# Altium footprint library PCBLIB.PcbLib: 557 footprints (part 10 of 36)
Each footprint in its own frame and in the unit in brackets; x right, y up, seen from the top. Pads: shape width x height; smd on the part's side, far side on the other; paste and mask are expansions set on the pad; w line width, h text height; cw(c..) or ccw(c..) is an arc to the next point about the centre after c.
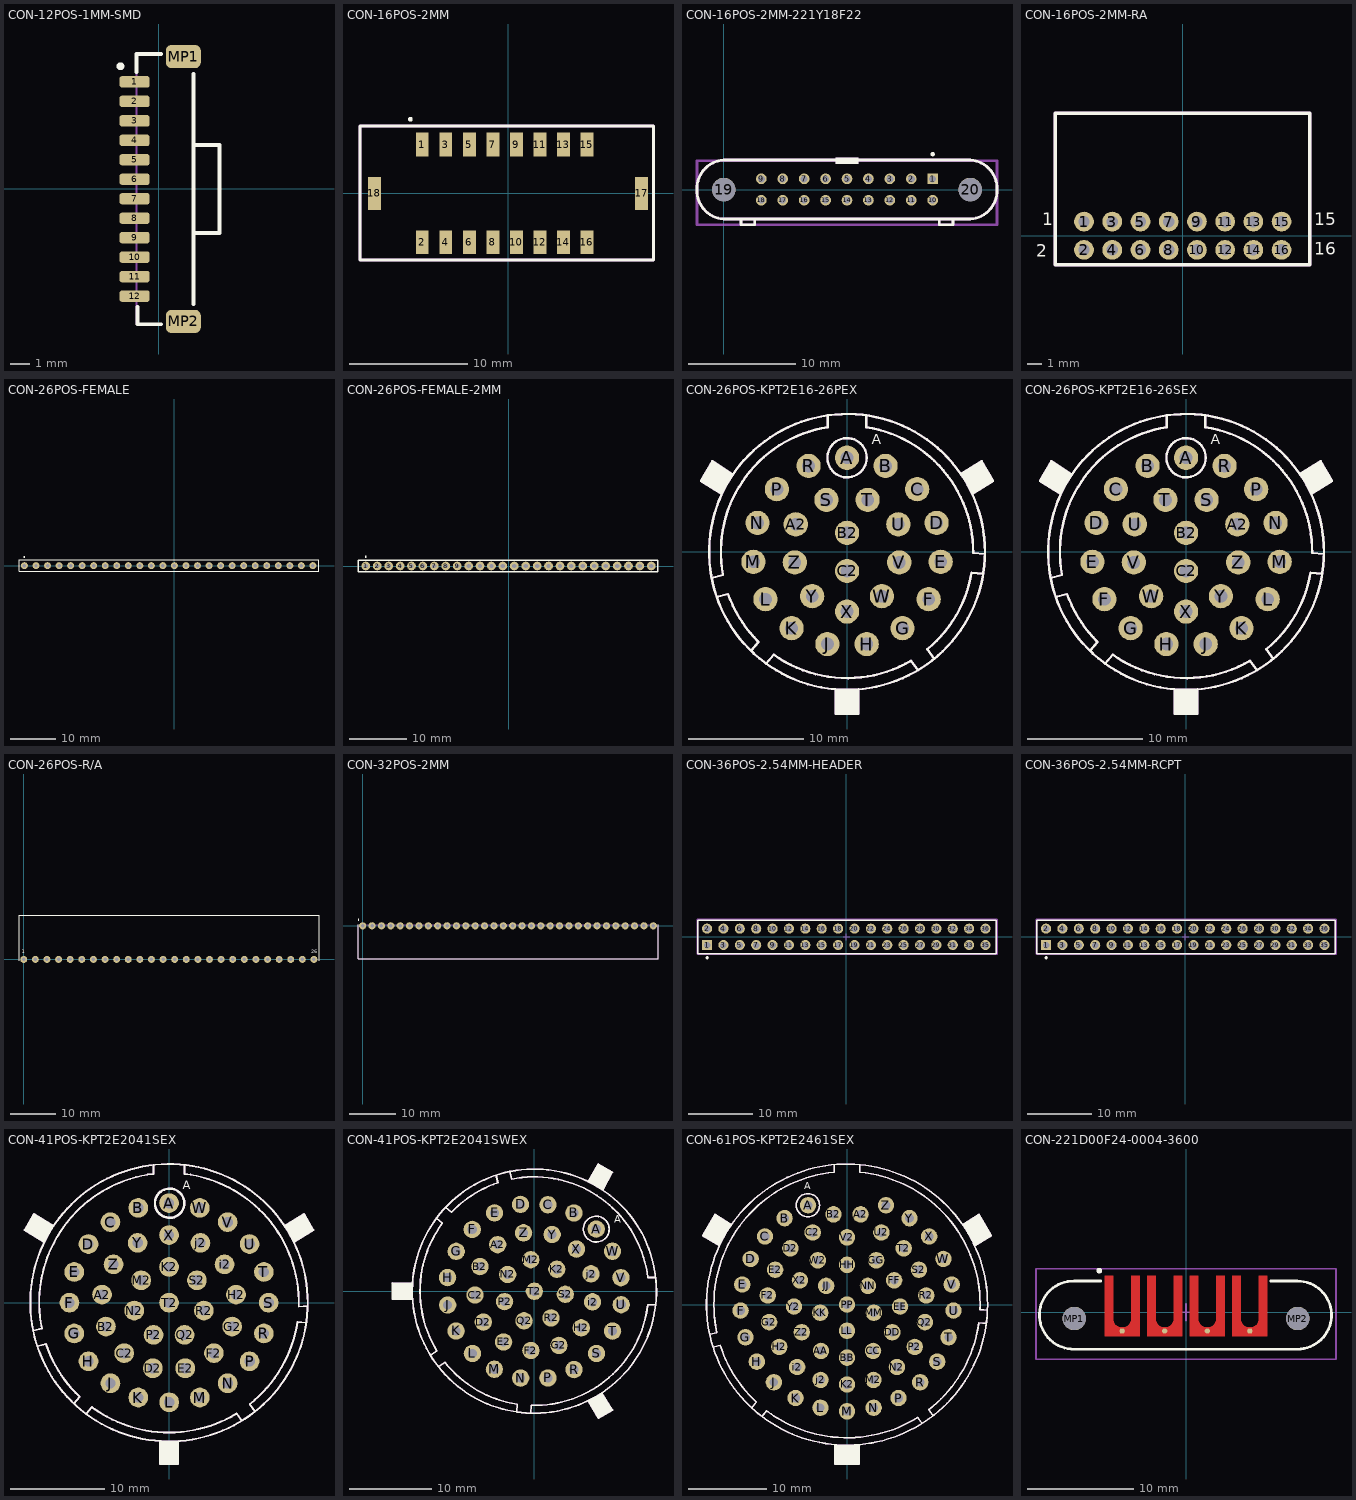
[diagram p9: the footprints below, top view; thin cyan lines are the x and y axes]

## CON-12POS-1MM-SMD [mm]
pads (14):
  rrect50% 1.55x0.6 smd mask+0.05: 1(-1.25,5.5) 2(-1.25,4.5) 3(-1.25,3.5) 4(-1.25,2.5) 5(-1.25,1.5) 6(-1.25,0.5) 7(-1.25,-0.5) 8(-1.25,-1.5) 9(-1.25,-2.5) 10(-1.25,-3.5) 11(-1.25,-4.5) 12(-1.25,-5.5)
  rrect50% 1.8x1.2 smd mask+0.05: MP1(1.25,6.8) MP2(1.25,-6.8)
Top Overlay:
  circle w0.2: c-1.98,6.3 r0.1
  lines w0.2: -1.16,6.01 -1.16,6.931 0.1,6.931 ; -1.102,-6.048 -1.102,-6.941 0.1,-6.941 ; 1.781,-5.9 1.781,-2.25 ; 1.781,5.9 1.781,2.25 ; 1.781,-2.25 3.11,-2.25 3.11,2.25 1.781,2.25 ; 1.781,-2.25 1.781,-2.25 ; 1.781,-2.25 1.781,2.25
ASM Top:
  lines w0.1: 0.1,-6.941 -1.16,-6.941 -1.16,6.01 -1.16,6.931 0.1,6.931 ; 1.781,-2.25 3.11,-2.25 ; 1.781,2.25 3.11,2.25 3.11,-2.25 ; 1.781,5.9 1.781,-5.9 ; 1.781,-5.9 1.781,-5.9 ; 3.11,-2.25 3.11,-2.25
  text ".designator" at 0.1,0 h0.8
3D body "5013311207.stp": height 5.5, standoff -0.04, extent -1.76,-7.12 3.59,7.12

## CON-16POS-2MM [mm]
pads (18):
  rect 1.1x2 smd: 1(-7.29,4.15) 2(-7.29,-4.15) 3(-5.29,4.15) 4(-5.29,-4.15) 5(-3.29,4.15) 6(-3.29,-4.15) 7(-1.29,4.15) 8(-1.29,-4.15) 9(0.71,4.15) 10(0.71,-4.15) 11(2.71,4.15) 12(2.71,-4.15) 13(4.71,4.15) 14(4.71,-4.15) 15(6.71,4.15) 16(6.71,-4.15)
  rect 1.1x2.8 smd: 17(11.35,0) 18(-11.35,0)
Top Overlay:
  circle w0.2: c-8.299,6.3 r0.1
  lines w0.254: -12.573,-5.664 -12.573,5.715 12.37,5.715 12.37,-5.664 -12.573,-5.664
ASM Top:
  lines w0.254: -12.573,-5.664 -12.573,5.715 12.37,5.715 12.37,-5.664 -12.573,-5.664
  text ".designator" at -8.001,-0.178 h0.8
3D body "DF11G-16DP-2V.stp": height 7.16, standoff -1.04, extent -12.118,-4.496 11.582,4.704

## CON-16POS-2MM-221Y18F22 [mm] "Nicomatic 221Y18F22"
height 5.6
pads (20):
  rect 1x1 hole 0.65: 1(19.5,1)
  round 1 hole 0.65: 2(17.5,1) 3(15.5,1) 4(13.5,1) 5(11.5,1) 6(9.5,1) 7(7.5,1) 8(5.5,1) 9(3.5,1) 10(19.5,-1) 11(17.5,-1) 12(15.5,-1) 13(13.5,-1) 14(11.5,-1) 15(9.5,-1) 16(7.5,-1) 17(5.5,-1) 18(3.5,-1)
  round 2.2 hole 2.2 unplated: 19(0,0) 20(23,0)
Top Overlay:
  circle w0.2: c19.501,3.3 r0.1
  rectangle: 10.438,2.4 12.585,3
  lines w0.254: 1.6,-2.75 1.6,-3.3 2.9,-3.3 2.9,-2.75 ; 20.1,-2.75 20.1,-3.3 21.4,-3.3 21.4,-2.75 ; -2.5,0 ccw(c0.125,-0.125) 0,-2.75 23,-2.75 ccw(c22.875,-0.125) 25.5,0 ccw(c22.875,0.125) 23,2.75 0,2.75 ccw(c0.125,0.125) -2.5,0
Mechanical 15:
  lines w0.254: -2.5,-3.3 -2.5,2.7 25.5,2.7 25.5,-3.3 -2.5,-3.3
ASM Top:
  rectangle: 10.438,2.4 12.585,3
  lines w0.254: 1.6,-2.75 1.6,-3.3 2.9,-3.3 2.9,-2.75 ; 20.1,-2.75 20.1,-3.3 21.4,-3.3 21.4,-2.75 ; -2.5,0 cw(c0.125,0.125) 0,2.75 23,2.75 cw(c22.875,0.125) 25.5,0 cw(c22.875,-0.125) 23,-2.75 0,-2.75 cw(c0.125,-0.125) -2.5,0
  text ".designator" at 9.1,-0.2 h0.8
3D body "221Y18F22.STEP": height 5.8, standoff -4.8, extent -2.499,-3.271 25.501,2.729

## CON-16POS-2MM-RA [mm]
pads (16):
  round 1.4 hole 0.8: 1(-7,1) 2(-7,-1) 3(-5,1) 4(-5,-1) 5(-3,1) 6(-3,-1) 7(-1,1) 8(-1,-1) 9(1,1) 10(1,-1) 11(3,1) 12(3,-1) 13(5,1) 14(5,-1) 15(7,1) 16(7,-1)
Top Overlay:
  lines w0.254: -9.032,-2.048 9.002,-2.048 9.002,8.671 -9.032,8.671 -9.032,-2.048
  text "1" at -9.946,0.416 h1.52
  text "2" at -10.404,-1.794 h1.52
  text "15" at 9.332,0.416 h1.52
  text "16" at 9.332,-1.667 h1.52
ASM Top:
  lines w0.254: -9.032,-2.048 -9.032,8.671 9.002,8.671 9.002,-2.048 -9.032,-2.048
  text ".designator" at -7.889,3.134 h0.8
3D body "DF11-16DPOS-2DS-RA.stp": height 5.16, standoff -2.84, extent -9.007,-1.337 8.993,8.663

## CON-26POS-FEMALE [mil]
pads (26):
  round 60 hole 30: 1(-1300,0) 2(-1200,0) 3(-1100,0) 4(-1000,0) 5(-900,0) 6(-800,0) 7(-700,0) 8(-600,0) 9(-500,0) 10(-400,0) 11(-300,0) 12(-200,0) 13(-100,0) 14(0,0) 15(100,0) 16(200,0) 17(300,0) 18(400,0) 19(500,0) 20(600,0) 21(700,0) 22(800,0) 23(900,0) 24(1000,0) 25(1100,0) 26(1200,0)
Top Overlay:
  circle w7.87: c-1300,74.8 r3.94
  lines w10: -1347.24,-50 -1347.24,50 1252.76,50 1252.76,-50 -1347.24,-50
3D body "SS-126-TT-2.stp": height 175.87, standoff -124.13, extent -1347.24,-50 1252.76,50

## CON-26POS-FEMALE-2MM [mil]
pads (26):
  round 60 hole 30: 1(-984.25,0) 2(-905.51,0) 3(-826.77,0) 4(-748.03,0) 5(-669.29,0) 6(-590.55,0) 7(-511.81,0) 8(-433.07,0) 9(-354.33,0) 10(-275.59,0) 11(-196.85,0) 12(-118.11,0) 13(-39.37,0) 14(39.37,0) 15(118.11,0) 16(196.85,0) 17(275.59,0) 18(354.33,0) 19(433.07,0) 20(511.81,0) 21(590.55,0) 22(669.29,0) 23(748.03,0) 24(826.77,0) 25(905.51,0) 26(984.25,0)
Top Overlay:
  circle w7.87: c-984.25,62.99 r3.94
  lines w10: -1038.04,-39.35 1030.15,-39.35 1030.15,39.35 -1038.04,39.35 -1038.04,-39.35
3D body "MMS-126-01-F-SV.stp": height 175, standoff -115, extent -1038.04,-39.35 1030.15,39.35

## CON-26POS-KPT2E16-26PEX [mm]
pads (26):
  round 2.1 hole 1.1: A(0,8.15) A2(-4.44,2.39) B(3.33,7.44) B2(0,1.65) C(6.07,5.43) C2(0,-1.65) D(7.75,2.51) E(8.1,-0.86) F(7.06,-4.09) G(4.8,-6.6) H(1.7,-7.97) J(-1.7,-7.97) K(-4.8,-6.6) L(-7.06,-4.09) M(-8.1,-0.86) N(-7.75,2.51) P(-6.07,5.43) R(-3.33,7.44) S(-1.78,4.5) T(1.78,4.5) U(4.44,2.39) V(4.52,-0.91) W(3.02,-3.83) X(0,-5.16) Y(-3.02,-3.83) Z(-4.52,-0.91)
Top Overlay:
  circle w0.2: c0,0 r11.934
  circle w0.2: c0,8.15 r1.7
  region: -0.994,-11.893 -0.994,-14.025 0.986,-14.025 0.994,-11.893
  region: 11.647,7.87 9.844,6.748 10.823,5.029 12.637,6.155
  region: -11.655,7.87 -12.645,6.155 -10.823,5.029 -9.89,6.679
  lines w0.2: -11.718,-2.254 -10.74,-1.992 ; -11.277,-3.906 -10.296,-3.644 ccw(c0,0) -7.655,-7.79 -8.308,-8.566 ; -10.823,5.029 -12.645,6.155 -11.655,7.87 -9.89,6.679 ; -10.733,-1.991 cw(c0.005,0) -1.66,10.794 -1.66,11.815 ; -6.997,-9.665 -6.345,-8.889 ccw(c0,0) 5.542,-9.41 ; -0.994,-11.893 -0.994,-14.025 0.986,-14.025 0.994,-11.893 ; 1.65,10.791 cw(c0,0) 10.916,-0.097 11.924,-0.185 ; 1.65,10.794 1.65,11.815 ; 5.541,-9.408 6.12,-10.238 ; 7.521,-9.257 6.941,-8.427 ccw(c0,0) 10.77,-1.789 ; 9.844,6.748 11.647,7.87 12.637,6.155 10.823,5.029 ; 10.767,-1.801 11.775,-1.889
  text "A" at 2.134,9.017 h1.5
ASM Top:
  circle w0.2: c0,8.15 r1.7
  circle w0.2: c0,0 r11.934
  region: -11.655,7.87 -12.645,6.155 -10.823,5.029 -9.89,6.679
  region: 11.647,7.87 9.844,6.748 10.823,5.029 12.637,6.155
  region: -0.994,-11.893 -0.994,-14.025 0.986,-14.025 0.994,-11.893
  lines w0.2: -11.718,-2.254 -10.74,-1.992 ; -11.277,-3.906 -10.296,-3.644 ccw(c0,0) -7.655,-7.79 -8.308,-8.566 ; -10.823,5.029 -12.645,6.155 -11.655,7.87 -9.89,6.679 ; -10.733,-1.991 cw(c0.005,0) -1.66,10.794 -1.66,11.815 ; -6.997,-9.665 -6.345,-8.889 ccw(c0,0) 5.542,-9.41 ; -0.994,-14.025 -0.994,-11.893 ; 0.986,-14.025 0.994,-11.893 ; 1.65,10.791 cw(c0,0) 10.916,-0.097 11.924,-0.185 ; 1.65,10.794 1.65,11.815 ; 5.541,-9.408 6.12,-10.238 ; 7.521,-9.257 6.941,-8.427 ccw(c0,0) 10.77,-1.789 ; 9.844,6.748 11.647,7.87 12.637,6.155 10.823,5.029 ; 10.767,-1.801 11.775,-1.889
  text ".designator" at -0.7,-0.2 h0.8
  text "A" at 2.134,9.017 h1.5
3D body "KPT2E1626PEX.stp": height 24, standoff -5.77, extent -15.449,-15.445 15.451,15.445

## CON-26POS-KPT2E16-26SEX [mm]
pads (26):
  round 2.1 hole 1.1: A(0,8.15) A2(4.44,2.39) B(-3.33,7.44) B2(0,1.65) C(-6.07,5.43) C2(0,-1.65) D(-7.75,2.51) E(-8.1,-0.86) F(-7.06,-4.09) G(-4.8,-6.6) H(-1.7,-7.97) J(1.7,-7.97) K(4.8,-6.6) L(7.06,-4.09) M(8.1,-0.86) N(7.75,2.51) P(6.07,5.43) R(3.33,7.44) S(1.78,4.5) T(-1.78,4.5) U(-4.44,2.39) V(-4.52,-0.91) W(-3.02,-3.83) X(0,-5.16) Y(3.02,-3.83) Z(4.52,-0.91)
Top Overlay:
  circle w0.2: c0,0 r11.934
  circle w0.2: c0,8.15 r1.7
  region: -0.994,-11.893 -0.994,-14.025 0.986,-14.025 0.994,-11.893
  region: 11.647,7.87 9.844,6.748 10.823,5.029 12.637,6.155
  region: -11.655,7.87 -12.645,6.155 -10.823,5.029 -9.89,6.679
  lines w0.2: -11.718,-2.254 -10.74,-1.992 ; -11.277,-3.906 -10.296,-3.644 ccw(c0,0) -7.655,-7.79 -8.308,-8.566 ; -10.823,5.029 -12.645,6.155 -11.655,7.87 -9.89,6.679 ; -10.733,-1.991 cw(c0.005,0) -1.66,10.794 -1.66,11.815 ; -6.997,-9.665 -6.345,-8.889 ccw(c0,0) 5.542,-9.41 ; -0.994,-11.893 -0.994,-14.025 0.986,-14.025 0.994,-11.893 ; 1.65,10.791 cw(c0,0) 10.916,-0.097 11.924,-0.185 ; 1.65,10.794 1.65,11.815 ; 5.541,-9.408 6.12,-10.238 ; 7.521,-9.257 6.941,-8.427 ccw(c0,0) 10.77,-1.789 ; 9.844,6.748 11.647,7.87 12.637,6.155 10.823,5.029 ; 10.767,-1.801 11.775,-1.889
  text "A" at 2.134,9.017 h1.5
ASM Top:
  circle w0.2: c0,8.15 r1.7
  circle w0.2: c0,0 r11.934
  region: -11.655,7.87 -12.645,6.155 -10.823,5.029 -9.89,6.679
  region: 11.647,7.87 9.844,6.748 10.823,5.029 12.637,6.155
  region: -0.994,-11.893 -0.994,-14.025 0.986,-14.025 0.994,-11.893
  lines w0.2: -11.718,-2.254 -10.74,-1.992 ; -11.277,-3.906 -10.296,-3.644 ccw(c0,0) -7.655,-7.79 -8.308,-8.566 ; -10.823,5.029 -12.645,6.155 -11.655,7.87 -9.89,6.679 ; -10.733,-1.991 cw(c0.005,0) -1.66,10.794 -1.66,11.815 ; -6.997,-9.665 -6.345,-8.889 ccw(c0,0) 5.542,-9.41 ; -0.994,-14.025 -0.994,-11.893 ; 0.986,-14.025 0.994,-11.893 ; 1.65,10.791 cw(c0,0) 10.916,-0.097 11.924,-0.185 ; 1.65,10.794 1.65,11.815 ; 5.541,-9.408 6.12,-10.238 ; 7.521,-9.257 6.941,-8.427 ccw(c0,0) 10.77,-1.789 ; 9.844,6.748 11.647,7.87 12.637,6.155 10.823,5.029 ; 10.767,-1.801 11.775,-1.889
  text ".designator" at -1.245,-0.127 h0.8
  text "A" at 2.134,9.017 h1.5
3D body "KPT2E1626SEX.stp": height 24, standoff -5.94, extent -15.449,-15.445 15.451,15.445

## CON-26POS-R/A [mil]
pads (26):
  round 60 hole 30: 1(0,0) 2(100,0) 3(200,0) 4(300,0) 5(400,0) 6(500,0) 7(600,0) 8(700,0) 9(800,0) 10(900,0) 11(1000,0) 12(1100,0) 13(1200,0) 14(1300,0) 15(1400,0) 16(1500,0) 17(1600,0) 18(1700,0) 19(1800,0) 20(1900,0) 21(2000,0) 22(2100,0) 23(2200,0) 24(2300,0) 25(2400,0) 26(2500,0)
Top Overlay:
  lines w10: -40.95,-11.93 -40.95,382.01 2543.31,382.01 ; 2543.31,-11.93 2543.31,382.01 ; 2543.31,382.01 2543.31,382.01
  text "26" at 2476.38,51.18 h32
  text "1" at -15.75,51.18 h32
3D body "26 POS HEADER RA.stp": height 100.02, standoff -97.94, extent -40.95,-11.93 2543.31,382.01

## CON-32POS-2MM [mil]
pads (32):
  round 60 hole 30: 1(0,0) 2(78.74,0) 3(157.48,0) 4(236.22,0) 5(314.96,0) 6(393.7,0) 7(472.44,0) 8(551.18,0) 9(629.92,0) 10(708.66,0) 11(787.4,0) 12(866.14,0) 13(944.88,0) 14(1023.62,0) 15(1102.36,0) 16(1181.1,0) 17(1259.84,0) 18(1338.58,0) 19(1417.32,0) 20(1496.06,0) 21(1574.8,0) 22(1653.54,0) 23(1732.28,0) 24(1811.02,0) 25(1889.76,0) 26(1968.5,0) 27(2047.24,0) 28(2125.98,0) 29(2204.72,0) 30(2283.46,0) 31(2362.2,0) 32(2440.94,0)
Top Overlay:
  circle w7.87: c-35.43,51.18 r3.94
  lines w10: -39.37,8.86 -39.37,-276.58 2480.32,-276.58 2480.32,8.86
ASM Top:
  lines w10: -39.37,-276.58 -39.37,8.86 2480.32,8.86 2480.32,-276.58 -39.37,-276.58
  text ".designator" at 1080.41,-156.5 h31.5
3D body "header_32pin_rightangle_2mm.stp": height 78.74, standoff -110.24, extent -39.37,-276.58 2480.32,8.86

## CON-36POS-2.54MM-HEADER [mm]
pads (36):
  rect 1.57x1.57 hole 1.02 paste-1000 mask+0: 1(-21.59,-1.27)
  round 1.57 hole 1.02 paste-1000 mask+0: 2(-21.59,1.27) 3(-19.05,-1.27) 4(-19.05,1.27) 5(-16.51,-1.27) 6(-16.51,1.27) 7(-13.97,-1.27) 8(-13.97,1.27) 9(-11.43,-1.27) 10(-11.43,1.27) 11(-8.89,-1.27) 12(-8.89,1.27) 13(-6.35,-1.27) 14(-6.35,1.27) 15(-3.81,-1.27) 16(-3.81,1.27) 17(-1.27,-1.27) 18(-1.27,1.27) 19(1.27,-1.27) 20(1.27,1.27) 21(3.81,-1.27) 22(3.81,1.27) 23(6.35,-1.27) 24(6.35,1.27) 25(8.89,-1.27) 26(8.89,1.27) 27(11.43,-1.27) 28(11.43,1.27) 29(13.97,-1.27) 30(13.97,1.27) 31(16.51,-1.27) 32(16.51,1.27) 33(19.05,-1.27) 34(19.05,1.27) 35(21.59,-1.27) 36(21.59,1.27)
Top Overlay:
  circle w0.25: c-21.575,-3.245 r0.125
  lines w0.2: -23.05,-2.605 23.27,-2.605 23.27,2.605 -23.05,2.605 -23.05,-2.605
Mechanical 15:
  lines w0.1: -0.5,0 0.5,0 ; 0,-0.5 0,0.5
  lines w0.2: -23.15,-2.705 23.37,-2.705 23.37,2.705 -23.15,2.705 -23.15,-2.705
ASM Top:
  lines w0.2: -23.05,-2.605 23.27,-2.605 23.27,2.605 -23.05,2.605 -23.05,-2.605
  text ".Designator" at -2.13,-0.3 h1
3D body "TSW-118-17-G-D.stp": height 18.3, standoff -2.78, extent -22.86,-2.54 22.86,2.54

## CON-36POS-2.54MM-RCPT [mm]
pads (36):
  rect 1.57x1.57 hole 1.02 paste-1000 mask+0: 1(-21.59,-1.27)
  round 1.57 hole 1.02 paste-1000 mask+0: 2(-21.59,1.27) 3(-19.05,-1.27) 4(-19.05,1.27) 5(-16.51,-1.27) 6(-16.51,1.27) 7(-13.97,-1.27) 8(-13.97,1.27) 9(-11.43,-1.27) 10(-11.43,1.27) 11(-8.89,-1.27) 12(-8.89,1.27) 13(-6.35,-1.27) 14(-6.35,1.27) 15(-3.81,-1.27) 16(-3.81,1.27) 17(-1.27,-1.27) 18(-1.27,1.27) 19(1.27,-1.27) 20(1.27,1.27) 21(3.81,-1.27) 22(3.81,1.27) 23(6.35,-1.27) 24(6.35,1.27) 25(8.89,-1.27) 26(8.89,1.27) 27(11.43,-1.27) 28(11.43,1.27) 29(13.97,-1.27) 30(13.97,1.27) 31(16.51,-1.27) 32(16.51,1.27) 33(19.05,-1.27) 34(19.05,1.27) 35(21.59,-1.27) 36(21.59,1.27)
Top Overlay:
  circle w0.25: c-21.575,-3.245 r0.125
  lines w0.2: -23.05,-2.605 -23.05,2.605 23.27,2.605 23.27,-2.605 -23.05,-2.605
Mechanical 15:
  lines w0.1: -0.5,0 0.5,0 ; 0,-0.5 0,0.5
  lines w0.2: -23.15,-2.705 -23.15,2.705 23.37,2.705 23.37,-2.705 -23.15,-2.705
ASM Top:
  lines w0.2: -23.05,-2.605 -23.05,2.605 23.27,2.605 23.27,-2.605 -23.05,-2.605
  text ".Designator" at -2.13,-0.3 h1
3D body "SSW-118-01-T-D.stp": height 8.52, standoff -2.63, extent -23.114,-2.476 23.114,2.477

## CON-41POS-KPT2E2041SEX [mm]
pads (41):
  round 2.1 hole 1.1: A(0,10.62) A2(-7.14,0.86) B(-3.28,10.11) B2(-6.73,-2.54) C(-6.25,8.59) C2(-4.78,-5.38) D(-8.59,6.25) D2(-1.73,-6.99) E(-10.11,3.28) E2(1.73,-6.99) F(-10.62,0) F2(4.78,-5.38) G(-10.11,-3.28) G2(6.73,-2.54) H(-8.59,-6.25) H2(7.14,0.86) i2(5.92,4.09) J(-6.25,-8.59) j2(3.35,6.38) K(-3.28,-10.11) K2(0,3.81) L(0.02,-10.62) M(3.28,-10.11) M2(-2.97,2.39) N(6.25,-8.59) N2(-3.71,-0.84) P(8.59,-6.25) P2(-1.65,-3.43) Q2(1.65,-3.43) R(10.11,-3.28) R2(3.71,-0.84) S(10.62,0) S2(2.97,2.39) T(10.11,3.28) T2(0,0) U(8.59,6.25) V(6.25,8.59) W(3.28,10.11) X(0,7.21) Y(-3.35,6.38) Z(-5.92,4.09)
Top Overlay:
  circle w0.254: c0.06,10.61 r1.561
  circle w0.2: c0,0 r14.79
  region: -14.405,9.457 -15.395,7.743 -13.316,6.436 -12.327,8.172
  region: -0.986,-14.757 -0.995,-17.2 0.985,-17.2 0.985,-14.757
  region: 14.396,9.457 12.327,8.172 13.3,6.469 15.386,7.743
  lines w0.2: -14.489,-2.996 -13.566,-2.749 ; -14.046,-4.648 -13.125,-4.401 ccw(c0,0) -9.524,-10.047 ; -13.565,-2.749 cw(c0,0) -1.653,13.741 ; -13.316,6.436 -15.395,7.743 -14.405,9.457 -12.327,8.172 ; -10.151,-10.761 -9.538,-10.032 ; -8.841,-11.861 -8.228,-11.131 ccw(c0,0) 7.226,-11.807 ; -1.659,13.741 -1.659,14.697 ; -0.986,-14.757 -0.995,-17.2 0.985,-17.2 0.985,-14.757 ; 1.651,14.697 1.651,13.741 cw(c0,0) 13.835,-0.352 ; 7.221,-11.806 7.763,-12.585 ; 8.609,-10.834 ccw(c0,0) 13.686,-2.047 ; 8.62,-10.825 9.164,-11.605 ; 12.327,8.172 14.396,9.457 15.386,7.743 13.3,6.469 ; 13.683,-2.056 14.629,-2.139 ; 13.833,-0.435 14.785,-0.352
  text "A" at 1.475,11.79 h1.52
ASM Top:
  circle w0.2: c0,0 r14.79
  circle w0.254: c0.06,10.61 r1.561
  region: 14.396,9.457 12.327,8.172 13.3,6.469 15.386,7.743
  region: -0.986,-14.757 -0.995,-17.2 0.985,-17.2 0.985,-14.757
  region: -14.405,9.457 -15.395,7.743 -13.316,6.436 -12.327,8.172
  lines w0.2: -14.489,-2.996 -13.566,-2.749 ; -14.046,-4.648 -13.125,-4.401 ccw(c0,0) -9.524,-10.047 ; -13.565,-2.749 cw(c0,0) -1.653,13.741 ; -13.316,6.436 -15.395,7.743 -14.405,9.457 -12.327,8.172 ; -10.151,-10.761 -9.538,-10.032 ; -8.841,-11.861 -8.228,-11.131 ccw(c0,0) 7.226,-11.807 ; -1.659,13.741 -1.659,14.697 ; -0.995,-17.2 -0.986,-14.757 ; 0.985,-17.2 0.985,-14.757 ; 1.651,14.697 1.651,13.741 cw(c0,0) 13.835,-0.352 ; 7.221,-11.806 7.763,-12.585 ; 8.609,-10.834 ccw(c0,0) 13.686,-2.047 ; 8.62,-10.825 9.164,-11.605 ; 12.327,8.172 14.396,9.457 15.386,7.743 13.3,6.469 ; 13.683,-2.056 14.629,-2.139 ; 13.833,-0.435 14.785,-0.352
  text ".designator" at -1.653,0 h0.8
  text "A" at 1.475,11.79 h1.52
3D body "KPT2E2041SEX.stp": height 26.32, standoff -5.18, extent -18.235,-18.23 18.236,18.23

## CON-41POS-KPT2E2041SWEX [mm]
pads (41):
  round 2.1 hole 1.1: A(7.5,7.51) A2(-4.44,5.63) B(4.79,9.47) B2(-6.59,2.97) C(1.64,10.46) C2(-7.18,-0.47) D(-1.67,10.51) D2(-6.18,-3.75) E(-4.82,9.48) E2(-3.72,-6.15) F(-7.52,7.48) F2(-0.42,-7.19) G(-9.46,4.82) G2(2.97,-6.57) H(-10.5,1.64) H2(5.68,-4.44) i2(7.05,-1.29) J(-10.49,-1.68) j2(6.87,2.1) K(-9.47,-4.82) K2(2.72,2.65) L(-7.5,-7.54) M(-4.84,-9.46) M2(-0.43,3.81) N(-1.65,-10.53) N2(-3.23,2.02) P(1.64,-10.51) P2(-3.6,-1.27) Q2(-1.24,-3.59) R(4.81,-9.5) R2(2.02,-3.24) S(7.53,-7.54) S2(3.75,-0.38) T(9.48,-4.84) T2(0,-0.01) U(10.52,-1.64) V(10.48,1.63) W(9.47,4.83) X(5.1,5.09) Y(2.16,6.86) Z(-1.3,7.06)
Top Overlay:
  circle w0.2: c7.5,7.51 r1.561
  region: 7.743,15.397 6.972,14.048 6.525,13.265 8.283,12.245 9.457,14.407
  pour cut-out: 9.601,-20.93
  region: 8.179,-12.335 6.516,-13.289 7.743,-15.384 9.457,-14.394
  region: -17.2,-0.984 -14.76,-0.984 -14.76,0.964 -17.2,0.996
  region: -21.184,-5.537
  lines w0.2: -14.76,-0.984 -17.2,-0.984 -17.2,0.996 -14.76,0.964 ; -11.862,8.844 cw(c0,-0.01) -10.761,10.153 -10.032,9.541 ; -11.861,8.843 -11.131,8.229 ccw(c0,0) -11.812,-7.219 ; -11.806,-7.215 -12.585,-7.761 ccw(c0,-0.01) -11.606,-9.163 ; -11.605,-9.162 -10.825,-8.616 ccw(c0,-0.01) -2.057,-13.685 ; -10.036,9.545 cw(c0,-0.01) -4.401,13.129 -4.648,14.048 cw(c0,-0.01) -2.996,14.49 -2.749,13.571 ; -2.748,13.565 cw(c0,0) 13.743,1.643 ; -2.056,-13.679 -2.139,-14.627 ccw(c0,-0.01) -0.435,-14.776 -0.352,-13.828 ccw(c0,-0.01) 13.726,-1.646 ; 8.277,12.25 ccw(c0,-0.01) 6.525,13.265 7.743,15.397 9.457,14.407 8.283,12.245 ; 13.741,-1.648 14.697,-1.648 ccw(c0,-0.01) 14.693,1.662 ; 13.741,1.662 14.697,1.662 ; 14.691,-1.647 cw(c0,0) 14.783,0 ; 6.516,-13.289 ccw(c0,-0.01) 8.179,-12.335 9.457,-14.394 7.743,-15.384 6.516,-13.289
  text "A" at 9.7,8 h1.52
ASM Top:
  circle w0.2: c7.5,7.51 r1.561
  region: -17.2,-0.984 -14.76,-0.984 -14.76,0.964 -17.2,0.996
  region: 8.179,-12.335 6.516,-13.289 7.743,-15.384 9.457,-14.394
  region: 7.743,15.397 6.972,14.048 6.525,13.265 8.283,12.245 9.457,14.407
  lines w0.2: -17.2,-0.984 -14.76,-0.984 ; -17.2,0.996 -14.76,0.964 ; -11.862,8.844 cw(c0,-0.01) -10.761,10.153 -10.032,9.541 ; -11.861,8.843 -11.131,8.229 ccw(c0,0) -11.812,-7.219 ; -11.806,-7.215 -12.585,-7.761 ccw(c0,-0.01) -11.606,-9.163 ; -11.605,-9.162 -10.825,-8.616 ccw(c0,-0.01) -2.057,-13.685 ; -10.036,9.545 cw(c0,-0.01) -4.401,13.129 -4.648,14.048 cw(c0,-0.01) -2.996,14.49 -2.749,13.571 ; -2.748,13.565 cw(c0,0) 13.743,1.643 ; -2.056,-13.679 -2.139,-14.627 ccw(c0,-0.01) -0.435,-14.776 -0.352,-13.828 ccw(c0,-0.01) 13.726,-1.646 ; 8.277,12.25 ccw(c0,-0.01) 6.525,13.265 7.743,15.397 9.457,14.407 8.283,12.245 ; 13.741,-1.648 14.697,-1.648 ccw(c0,-0.01) 14.693,1.662 ; 13.741,1.662 14.697,1.662 ; 14.691,-1.647 cw(c0,0) 14.783,0 ; 6.516,-13.289 ccw(c0,-0.01) 8.179,-12.335 9.457,-14.394 7.743,-15.384 6.516,-13.289
  text ".designator" at -1.118,-0.076 h0.8
  text "A" at 9.7,8 h1.52
3D body "KPT2E2041SWEX.stp": height 26.32, standoff -5.18, extent -18.23,-18.238 18.23,18.238

## CON-61POS-KPT2E2461SEX [mm]
pads (61):
  round 2.1 hole 1.1: A(-4.98,12.7) A2(1.73,11.53) AA(-3.33,-5.92) B(-7.98,11.05) B2(-1.73,11.53) BB(0,-6.78) C(-10.49,8.71) C2(-4.39,9.22) CC(3.33,-5.92) D(-12.32,5.84) D2(-7.24,7.19) DD(5.79,-3.53) E(-13.39,2.57) E2(-9.19,4.45) EE(6.78,-0.25) F(-13.61,-0.76) F2(-10.13,1.17) FF(6.02,3.1) G(-12.98,-4.17) G2(-9.96,-2.24) GG(3.73,5.66) H(-11.53,-7.29) H2(-8.66,-5.41) HH(0,5.08) i2(-6.38,-7.98) J(-9.35,-9.93) j2(-3.38,-9.63) JJ(-2.67,2.39) K(-6.58,-11.94) K2(0,-10.21) KK(-3.43,-1.04) L(-3.4,-13.18) LL(0,-3.35) M(0,-13.64) M2(3.38,-9.63) MM(3.43,-1.04) N(3.4,-13.18) N2(6.38,-7.98) NN(2.67,2.39) P(6.58,-11.94) P2(8.66,-5.41) PP(0,0) Q2(9.96,-2.24) R(9.35,-9.93) R2(10.13,1.17) S(11.53,-7.29) S2(9.19,4.45) T(12.98,-4.17) T2(7.24,7.19) U(13.61,-0.76) U2(4.39,9.22) V(13.39,2.57) V2(0,8.59) W(12.32,5.84) W2(-3.73,5.66) X(10.49,8.71) X2(-6.02,3.1) Y(7.98,11.05) Y2(-6.78,-0.25) Z(4.98,12.7) Z2(-5.79,-3.53)
Top Overlay:
  circle w0.2: c-5,12.7 r1.487
  circle w0.2: c0,0 r17.964
  region: 14.773,10.222 16.846,11.564 18.436,8.81 16.326,7.515
  region: -18.445,8.81 -16.318,7.509 -14.774,10.221 -16.855,11.564
  region: -1.594,-17.893 -1.594,-20.375 1.586,-20.375 1.586,-17.894
  lines w0.2: -16.641,-3.572 -17.56,-3.819 ccw(c0,0) -17.117,-5.47 -16.199,-5.224 ccw(c0,0) -11.585,-12.469 ; -16.635,-3.571 cw(c0,0) -1.66,16.933 ; -16.318,7.509 -18.445,8.81 -16.855,11.564 -14.774,10.221 ; -11.584,-12.468 -12.195,-13.197 ccw(c0,0) -10.885,-14.296 -10.274,-13.567 ccw(c0,0) 9.045,-14.416 ; -1.66,16.934 -1.66,17.648 -1.66,17.888 cw(c0,0) 1.65,17.888 1.65,16.934 ; -1.594,-17.893 -1.594,-20.375 1.586,-20.375 1.586,-17.894 ; 1.649,16.93 cw(c0,0) 16.998,-0.629 17.945,-0.712 cw(c0,0) 17.796,-2.416 16.849,-2.333 ; 9.041,-14.411 9.587,-15.19 ; 9.587,-15.189 ccw(c0,0) 10.988,-14.209 10.442,-13.43 ccw(c0,0) 16.851,-2.333 ; 14.773,10.222 16.846,11.564 18.436,8.81 16.326,7.515
  text "A" at -5.5,14.4 h1.5
ASM Top:
  circle w0.2: c0,0 r17.964
  circle w0.2: c-5,12.7 r1.487
  region: -1.594,-17.893 -1.594,-20.375 1.586,-20.375 1.586,-17.894
  region: -18.445,8.81 -16.318,7.509 -14.774,10.221 -16.855,11.564
  region: 14.773,10.222 16.846,11.564 18.436,8.81 16.326,7.515
  lines w0.2: -16.641,-3.572 -17.56,-3.819 ccw(c0,0) -17.117,-5.47 -16.199,-5.224 ccw(c0,0) -11.585,-12.469 ; -16.635,-3.571 cw(c0,0) -1.66,16.933 ; -16.318,7.509 -18.445,8.81 -16.855,11.564 -14.774,10.221 ; -11.584,-12.468 -12.195,-13.197 ccw(c0,0) -10.885,-14.296 -10.274,-13.567 ccw(c0,0) 9.045,-14.416 ; -1.66,16.934 -1.66,17.648 -1.66,17.888 cw(c0,0) 1.65,17.888 1.65,16.934 ; -1.594,-17.893 -1.594,-20.375 1.586,-20.375 1.586,-17.894 ; 1.649,16.93 cw(c0,0) 16.998,-0.629 17.945,-0.712 cw(c0,0) 17.796,-2.416 16.849,-2.333 ; 9.041,-14.411 9.587,-15.19 ; 9.587,-15.189 ccw(c0,0) 10.988,-14.209 10.442,-13.43 ccw(c0,0) 16.851,-2.333 ; 14.773,10.222 16.846,11.564 18.436,8.81 16.326,7.515
  text "A" at -5.5,14.4 h1.5
  text ".designator" at -1.346,-0.127 h0.8
3D body "KPT2E2461SEX.stp": height 26.35, standoff -5.18, extent -21.415,-21.41 21.416,21.41

## CON-221D00F24-0004-3600 [mm]
pads (6):
  round 0.5 smd mask+0.05: 1(-6,-1.762) 2(-2,-1.762) 3(2,-1.762) 4(6,-1.762)
  round 2.2 hole 2.2 unplated mask+0: MP1(-10.5,-0.587) MP2(10.5,-0.587)
Top Layer:
  region: 4.35,3.413 4.35,-2.238 7.65,-2.238 7.65,3.412 6.85,3.412 6.85,-0.587 6.843,-0.698 6.785,-0.913 6.674,-1.105 6.517,-1.262 6.325,-1.373 6.111,-1.43 5.889,-1.43 5.675,-1.373 5.483,-1.262 5.326,-1.105 5.215,-0.913 5.157,-0.698 5.15,-0.588 5.15,3.413
  region: 0.35,3.413 0.35,-2.238 3.65,-2.238 3.65,3.412 2.85,3.412 2.85,-0.587 2.843,-0.698 2.785,-0.913 2.674,-1.105 2.517,-1.262 2.325,-1.373 2.111,-1.43 1.889,-1.43 1.675,-1.373 1.483,-1.262 1.326,-1.105 1.215,-0.913 1.157,-0.698 1.15,-0.588 1.15,3.413
  region: -3.65,3.413 -3.65,-2.238 -0.35,-2.238 -0.35,3.412 -1.15,3.412 -1.15,-0.587 -1.157,-0.698 -1.215,-0.913 -1.326,-1.105 -1.483,-1.262 -1.675,-1.373 -1.889,-1.43 -2.111,-1.43 -2.325,-1.373 -2.517,-1.262 -2.674,-1.105 -2.785,-0.913 -2.843,-0.698 -2.85,-0.588 -2.85,3.413
  region: -7.65,3.413 -7.65,-2.238 -4.35,-2.238 -4.35,3.412 -5.15,3.412 -5.15,-0.587 -5.157,-0.698 -5.215,-0.913 -5.326,-1.105 -5.483,-1.262 -5.675,-1.373 -5.889,-1.43 -6.111,-1.43 -6.325,-1.373 -6.517,-1.262 -6.674,-1.105 -6.785,-0.913 -6.843,-0.698 -6.85,-0.588 -6.85,3.413
Top Overlay:
  circle w0.3: c-8.15,3.912 r0.12
  lines w0.254: -8,2.937 -10.5,2.937 ccw(c-10.575,-0.263) -10.5,-3.463 10.475,-3.462 ccw(c10.475,-0.263) 10.475,2.937 7.975,2.937
Top Paste:
  region: 4.35,3.413 5.15,3.413 5.15,-0.573 5.154,-0.657 5.187,-0.822 5.251,-0.977 5.345,-1.117 5.463,-1.236 5.603,-1.329 5.758,-1.393 5.923,-1.426 6.007,-1.43 6.09,-1.426 6.252,-1.394 6.405,-1.331 6.542,-1.239 6.659,-1.122 6.751,-0.985 6.814,-0.832 6.846,-0.67 6.85,-0.587 6.85,3.412 7.65,3.412 7.65,-2.238 4.35,-2.238
  region: 0.35,3.413 1.15,3.413 1.15,-0.573 1.154,-0.657 1.187,-0.822 1.251,-0.977 1.345,-1.117 1.463,-1.236 1.603,-1.329 1.758,-1.393 1.923,-1.426 2.007,-1.43 2.09,-1.426 2.252,-1.394 2.405,-1.331 2.542,-1.239 2.659,-1.122 2.751,-0.985 2.814,-0.832 2.846,-0.67 2.85,-0.587 2.85,3.412 3.65,3.412 3.65,-2.238 0.35,-2.238
  region: -3.65,3.413 -2.85,3.413 -2.85,-0.573 -2.846,-0.657 -2.813,-0.822 -2.749,-0.977 -2.655,-1.117 -2.537,-1.236 -2.397,-1.329 -2.242,-1.393 -2.077,-1.426 -1.993,-1.43 -1.91,-1.426 -1.748,-1.394 -1.595,-1.331 -1.458,-1.239 -1.341,-1.122 -1.249,-0.985 -1.186,-0.832 -1.154,-0.67 -1.15,-0.587 -1.15,3.412 -0.35,3.412 -0.35,-2.238 -3.65,-2.238
  region: -7.65,3.413 -6.85,3.413 -6.85,-0.573 -6.846,-0.657 -6.813,-0.822 -6.749,-0.977 -6.655,-1.117 -6.537,-1.236 -6.397,-1.329 -6.242,-1.393 -6.077,-1.426 -5.993,-1.43 -5.91,-1.426 -5.748,-1.394 -5.595,-1.331 -5.458,-1.239 -5.341,-1.122 -5.249,-0.985 -5.186,-0.832 -5.154,-0.67 -5.15,-0.587 -5.15,3.412 -4.35,3.412 -4.35,-2.238 -7.65,-2.238
Top Solder:
  region: 4.325,3.425 4.325,-2.275 7.675,-2.275 7.675,3.425 6.825,3.425 6.825,-0.783 6.779,-0.916 6.626,-1.15 6.405,-1.323 6.14,-1.414 5.86,-1.414 5.595,-1.323 5.374,-1.15 5.221,-0.916 5.175,-0.783 5.175,3.425
  region: 0.325,3.425 0.325,-2.275 3.675,-2.275 3.675,3.425 2.825,3.425 2.825,-0.783 2.779,-0.916 2.626,-1.15 2.405,-1.323 2.14,-1.414 1.86,-1.414 1.595,-1.323 1.374,-1.15 1.221,-0.916 1.175,-0.783 1.175,3.425
  region: -3.675,3.425 -3.675,-2.275 -0.325,-2.275 -0.325,3.425 -1.175,3.425 -1.175,-0.783 -1.221,-0.916 -1.374,-1.15 -1.595,-1.323 -1.86,-1.414 -2.14,-1.414 -2.405,-1.323 -2.626,-1.15 -2.779,-0.916 -2.825,-0.783 -2.825,3.425
  region: -7.675,3.425 -7.675,-2.275 -4.325,-2.275 -4.325,3.425 -5.175,3.425 -5.175,-0.783 -5.221,-0.916 -5.374,-1.15 -5.595,-1.323 -5.86,-1.414 -6.14,-1.414 -6.405,-1.323 -6.626,-1.15 -6.779,-0.916 -6.825,-0.783 -6.825,3.425
Mechanical 15:
  lines w0.15: -0.8,0 0,0 ; 0,-0.8 0,0 ; 0,0.8 0,0 ; 0.8,0 0,0 ; -14.1,-4.413 -14.1,4.088 14.1,4.088 14.1,3.487 14.1,-4.413 -14.1,-4.413
3D body "221D00F24-0004-3600.STEP": height 5.86, standoff -6.24, extent -13,-3.337 13,2.767
3D body: height 0.25, standoff 0, extent -1.905,6.302 -1.905,6.302